# Altium footprint library Connector_PinHeader_1.27mm.PcbLib: 278 footprints (part 13 of 18)
Each footprint in its own frame and in the unit in brackets; x right, y up, seen from the top. Pads: shape width x height; smd on the part's side, far side on the other; paste and mask are expansions set on the pad; w line width, h text height; cw(c..) or ccw(c..) is an arc to the next point about the centre after c.
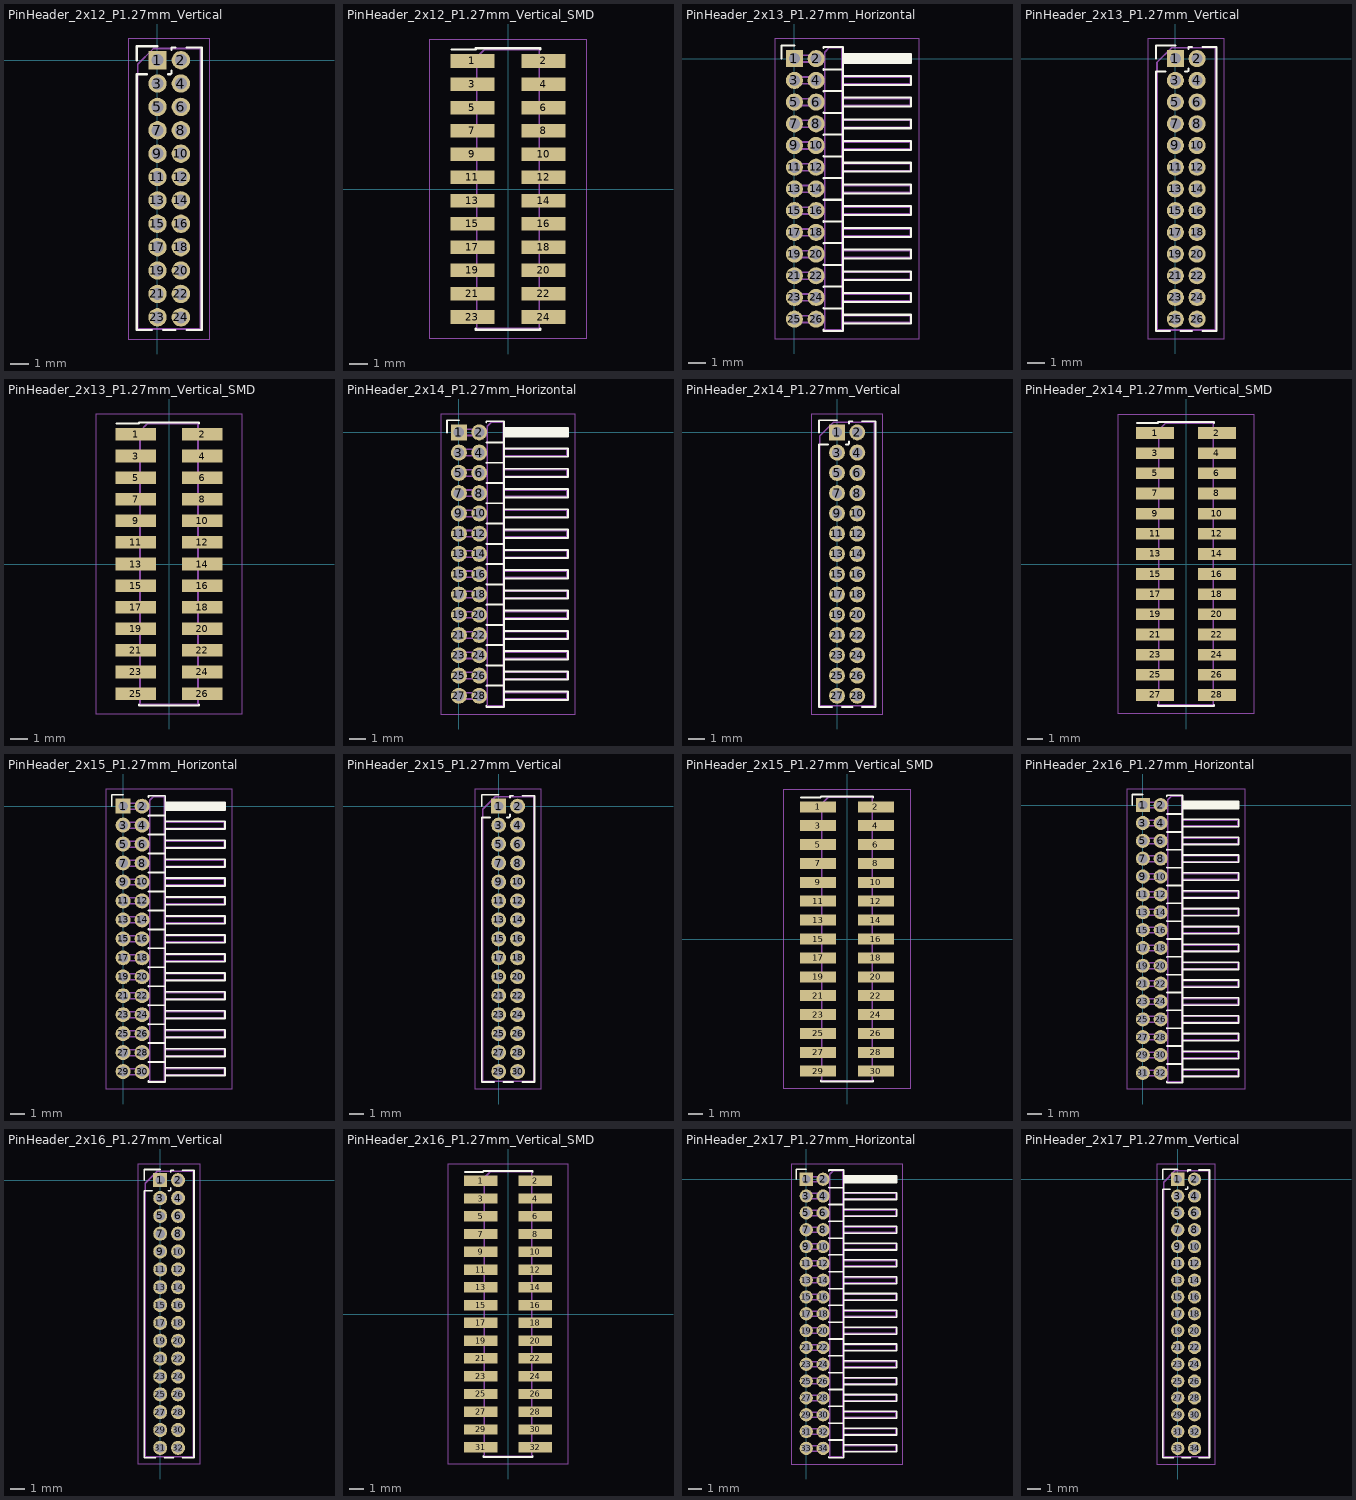
[diagram p12: the footprints below, top view; thin cyan lines are the x and y axes]

## PinHeader_2x12_P1.27mm_Vertical [mm]
pads (24):
  rect 1x1 hole 0.65: 1(0,0)
  rrect100% 1x1 hole 0.65: 2(1.27,0) 3(0,-1.27) 4(1.27,-1.27) 5(0,-2.54) 6(1.27,-2.54) 7(0,-3.81) 8(1.27,-3.81) 9(0,-5.08) 10(1.27,-5.08) 11(0,-6.35) 12(1.27,-6.35) 13(0,-7.62) 14(1.27,-7.62) 15(0,-8.89) 16(1.27,-8.89) 17(0,-10.16) 18(1.27,-10.16) 19(0,-11.43) 20(1.27,-11.43) 21(0,-12.7) 22(1.27,-12.7) 23(0,-13.97) 24(1.27,-13.97)
F.SilkS:
  lines w0.12: -1.13,0 -1.13,0.76 0,0.76 ; -0.563,-0.76 -1.13,-0.76 -1.13,-14.665 -0.308,-14.665 ; 0.308,-14.665 0.962,-14.665 ; 0.563,-0.76 0.707,-0.76 ; 0.76,-0.707 0.76,-0.563 ; 0.76,0.563 0.76,0.695 0.962,0.695 ; 1.578,-14.665 2.4,-14.665 2.4,0.695 1.578,0.695
F.CrtYd:
  lines w0.05: -1.6,-15.15 2.85,-15.15 2.85,1.15 -1.6,1.15 -1.6,-15.15
F.Fab:
  lines w0.1: -1.07,-14.605 -1.07,-0.218 -0.218,0.635 2.34,0.635 2.34,-14.605 -1.07,-14.605
  text "'.Designator'" at 1.475,-11.032 h1

## PinHeader_2x12_P1.27mm_Vertical_SMD [mm]
pads (24):
  rect 2.4x0.74 smd: 1(-1.95,6.985) 2(1.95,6.985) 3(-1.95,5.715) 4(1.95,5.715) 5(-1.95,4.445) 6(1.95,4.445) 7(-1.95,3.175) 8(1.95,3.175) 9(-1.95,1.905) 10(1.95,1.905) 11(-1.95,0.635) 12(1.95,0.635) 13(-1.95,-0.635) 14(1.95,-0.635) 15(-1.95,-1.905) 16(1.95,-1.905) 17(-1.95,-3.175) 18(1.95,-3.175) 19(-1.95,-4.445) 20(1.95,-4.445) 21(-1.95,-5.715) 22(1.95,-5.715) 23(-1.95,-6.985) 24(1.95,-6.985)
F.SilkS:
  lines w0.12: -3.09,7.615 -1.765,7.615 -1.765,7.68 1.765,7.68 1.765,7.615 ; -1.765,-7.615 -1.765,-7.68 1.765,-7.68 1.765,-7.615
F.CrtYd:
  lines w0.05: -4.3,-8.15 4.3,-8.15 4.3,8.15 -4.3,8.15 -4.3,-8.15
F.Fab:
  lines w0.1: -1.705,-7.185 -2.75,-7.185 -2.75,-6.785 -1.705,-6.785 ; -1.705,-5.915 -2.75,-5.915 -2.75,-5.515 -1.705,-5.515 ; -1.705,-4.645 -2.75,-4.645 -2.75,-4.245 -1.705,-4.245 ; -1.705,-3.375 -2.75,-3.375 -2.75,-2.975 -1.705,-2.975 ; -1.705,-2.105 -2.75,-2.105 -2.75,-1.705 -1.705,-1.705 ; -1.705,-0.835 -2.75,-0.835 -2.75,-0.435 -1.705,-0.435 ; -1.705,0.435 -2.75,0.435 -2.75,0.835 -1.705,0.835 ; -1.705,1.705 -2.75,1.705 -2.75,2.105 -1.705,2.105 ; -1.705,2.975 -2.75,2.975 -2.75,3.375 -1.705,3.375 ; -1.705,4.245 -2.75,4.245 -2.75,4.645 -1.705,4.645 ; -1.705,5.515 -2.75,5.515 -2.75,5.915 -1.705,5.915 ; -1.705,6.785 -2.75,6.785 -2.75,7.185 -1.705,7.185 ; 1.705,-7.185 2.75,-7.185 2.75,-6.785 1.705,-6.785 ; 1.705,-5.915 2.75,-5.915 2.75,-5.515 1.705,-5.515 ; 1.705,-4.645 2.75,-4.645 2.75,-4.245 1.705,-4.245 ; 1.705,-3.375 2.75,-3.375 2.75,-2.975 1.705,-2.975 ; 1.705,-2.105 2.75,-2.105 2.75,-1.705 1.705,-1.705 ; 1.705,-0.835 2.75,-0.835 2.75,-0.435 1.705,-0.435 ; 1.705,0.435 2.75,0.435 2.75,0.835 1.705,0.835 ; 1.705,1.705 2.75,1.705 2.75,2.105 1.705,2.105 ; 1.705,2.975 2.75,2.975 2.75,3.375 1.705,3.375 ; 1.705,4.245 2.75,4.245 2.75,4.645 1.705,4.645 ; 1.705,5.515 2.75,5.515 2.75,5.915 1.705,5.915 ; 1.705,6.785 2.75,6.785 2.75,7.185 1.705,7.185 ; -1.705,7.185 -1.27,7.62 1.705,7.62 1.705,-7.62 -1.705,-7.62 -1.705,7.185
  text "'.Designator'" at 0.84,-4.047 h1

## PinHeader_2x13_P1.27mm_Horizontal [mm]
pads (26):
  rect 1x1 hole 0.65: 1(0,0)
  rrect100% 1x1 hole 0.65: 2(1.27,0) 3(0,-1.27) 4(1.27,-1.27) 5(0,-2.54) 6(1.27,-2.54) 7(0,-3.81) 8(1.27,-3.81) 9(0,-5.08) 10(1.27,-5.08) 11(0,-6.35) 12(1.27,-6.35) 13(0,-7.62) 14(1.27,-7.62) 15(0,-8.89) 16(1.27,-8.89) 17(0,-10.16) 18(1.27,-10.16) 19(0,-11.43) 20(1.27,-11.43) 21(0,-12.7) 22(1.27,-12.7) 23(0,-13.97) 24(1.27,-13.97) 25(0,-15.24) 26(1.27,-15.24)
F.SilkS:
  lines w0.12: -0.76,0 -0.76,0.76 0,0.76 ; 1.71,-15.86 1.71,-15.935 2.83,-15.935 2.83,0.695 1.71,0.695 1.71,0.62 ; 1.71,-14.62 1.71,-14.59 ; 1.71,-14.605 2.83,-14.605 ; 1.71,-13.35 1.71,-13.32 ; 1.71,-13.335 2.83,-13.335 ; 1.71,-12.08 1.71,-12.05 ; 1.71,-12.065 2.83,-12.065 ; 1.71,-10.81 1.71,-10.78 ; 1.71,-10.795 2.83,-10.795 ; 1.71,-9.54 1.71,-9.51 ; 1.71,-9.525 2.83,-9.525 ; 1.71,-8.27 1.71,-8.24 ; 1.71,-8.255 2.83,-8.255 ; 1.71,-7 1.71,-6.97 ; 1.71,-6.985 2.83,-6.985 ; 1.71,-5.73 1.71,-5.7 ; 1.71,-5.715 2.83,-5.715 ; 1.71,-4.46 1.71,-4.43 ; 1.71,-4.445 2.83,-4.445 ; 1.71,-3.19 1.71,-3.16 ; 1.71,-3.175 2.83,-3.175 ; 1.71,-1.92 1.71,-1.89 ; 1.71,-1.905 2.83,-1.905 ; 1.71,-0.65 1.71,-0.62 ; 1.71,-0.635 2.83,-0.635 ; 2.83,-15.5 6.83,-15.5 6.83,-14.98 2.83,-14.98 ; 2.83,-14.23 6.83,-14.23 6.83,-13.71 2.83,-13.71 ; 2.83,-12.96 6.83,-12.96 6.83,-12.44 2.83,-12.44 ; 2.83,-11.69 6.83,-11.69 6.83,-11.17 2.83,-11.17 ; 2.83,-10.42 6.83,-10.42 6.83,-9.9 2.83,-9.9 ; 2.83,-9.15 6.83,-9.15 6.83,-8.63 2.83,-8.63 ; 2.83,-7.88 6.83,-7.88 6.83,-7.36 2.83,-7.36 ; 2.83,-6.61 6.83,-6.61 6.83,-6.09 2.83,-6.09 ; 2.83,-5.34 6.83,-5.34 6.83,-4.82 2.83,-4.82 ; 2.83,-4.07 6.83,-4.07 6.83,-3.55 2.83,-3.55 ; 2.83,-2.8 6.83,-2.8 6.83,-2.28 2.83,-2.28 ; 2.83,-1.53 6.83,-1.53 6.83,-1.01 2.83,-1.01 ; 2.83,-0.26 6.83,-0.26 6.83,0.26 2.83,0.26 ; 2.83,-0.16 6.83,-0.16 ; 2.83,-0.04 6.83,-0.04 ; 2.83,0.08 6.83,0.08 ; 2.83,0.2 6.83,0.2
F.CrtYd:
  lines w0.05: -1.15,-16.4 -1.15,1.15 7.3,1.15 7.3,-16.4 -1.15,-16.4
F.Fab:
  lines w0.1: 1.77,-15.44 -0.2,-15.44 -0.2,-15.04 1.77,-15.04 ; 1.77,-14.17 -0.2,-14.17 -0.2,-13.77 1.77,-13.77 ; 1.77,-12.9 -0.2,-12.9 -0.2,-12.5 1.77,-12.5 ; 1.77,-11.63 -0.2,-11.63 -0.2,-11.23 1.77,-11.23 ; 1.77,-10.36 -0.2,-10.36 -0.2,-9.96 1.77,-9.96 ; 1.77,-9.09 -0.2,-9.09 -0.2,-8.69 1.77,-8.69 ; 1.77,-7.82 -0.2,-7.82 -0.2,-7.42 1.77,-7.42 ; 1.77,-6.55 -0.2,-6.55 -0.2,-6.15 1.77,-6.15 ; 1.77,-5.28 -0.2,-5.28 -0.2,-4.88 1.77,-4.88 ; 1.77,-4.01 -0.2,-4.01 -0.2,-3.61 1.77,-3.61 ; 1.77,-2.74 -0.2,-2.74 -0.2,-2.34 1.77,-2.34 ; 1.77,-1.47 -0.2,-1.47 -0.2,-1.07 1.77,-1.07 ; 1.77,-0.2 -0.2,-0.2 -0.2,0.2 1.77,0.2 ; 2.77,-15.44 6.77,-15.44 6.77,-15.04 2.77,-15.04 ; 2.77,-14.17 6.77,-14.17 6.77,-13.77 2.77,-13.77 ; 2.77,-12.9 6.77,-12.9 6.77,-12.5 2.77,-12.5 ; 2.77,-11.63 6.77,-11.63 6.77,-11.23 2.77,-11.23 ; 2.77,-10.36 6.77,-10.36 6.77,-9.96 2.77,-9.96 ; 2.77,-9.09 6.77,-9.09 6.77,-8.69 2.77,-8.69 ; 2.77,-7.82 6.77,-7.82 6.77,-7.42 2.77,-7.42 ; 2.77,-6.55 6.77,-6.55 6.77,-6.15 2.77,-6.15 ; 2.77,-5.28 6.77,-5.28 6.77,-4.88 2.77,-4.88 ; 2.77,-4.01 6.77,-4.01 6.77,-3.61 2.77,-3.61 ; 2.77,-2.74 6.77,-2.74 6.77,-2.34 2.77,-2.34 ; 2.77,-1.47 6.77,-1.47 6.77,-1.07 2.77,-1.07 ; 2.77,-0.2 6.77,-0.2 6.77,0.2 2.77,0.2 ; 1.77,-15.875 2.77,-15.875 2.77,0.635 2.02,0.635 1.77,0.385 1.77,-15.875
  text "'.Designator'" at 2.774,-10.048 h0.6

## PinHeader_2x13_P1.27mm_Vertical [mm]
pads (26):
  rect 1x1 hole 0.65: 1(0,0)
  rrect100% 1x1 hole 0.65: 2(1.27,0) 3(0,-1.27) 4(1.27,-1.27) 5(0,-2.54) 6(1.27,-2.54) 7(0,-3.81) 8(1.27,-3.81) 9(0,-5.08) 10(1.27,-5.08) 11(0,-6.35) 12(1.27,-6.35) 13(0,-7.62) 14(1.27,-7.62) 15(0,-8.89) 16(1.27,-8.89) 17(0,-10.16) 18(1.27,-10.16) 19(0,-11.43) 20(1.27,-11.43) 21(0,-12.7) 22(1.27,-12.7) 23(0,-13.97) 24(1.27,-13.97) 25(0,-15.24) 26(1.27,-15.24)
F.SilkS:
  lines w0.12: -1.13,0 -1.13,0.76 0,0.76 ; -0.563,-0.76 -1.13,-0.76 -1.13,-15.935 -0.308,-15.935 ; 0.308,-15.935 0.962,-15.935 ; 0.563,-0.76 0.707,-0.76 ; 0.76,-0.707 0.76,-0.563 ; 0.76,0.563 0.76,0.695 0.962,0.695 ; 1.578,-15.935 2.4,-15.935 2.4,0.695 1.578,0.695
F.CrtYd:
  lines w0.05: -1.6,-16.4 2.85,-16.4 2.85,1.15 -1.6,1.15 -1.6,-16.4
F.Fab:
  lines w0.1: -1.07,-15.875 2.34,-15.875 2.34,0.635 -0.218,0.635 -1.07,-0.218 -1.07,-15.875
  text "'.Designator'" at 1.475,-11.667 h1

## PinHeader_2x13_P1.27mm_Vertical_SMD [mm]
pads (26):
  rect 2.4x0.74 smd: 1(-1.95,7.62) 2(1.95,7.62) 3(-1.95,6.35) 4(1.95,6.35) 5(-1.95,5.08) 6(1.95,5.08) 7(-1.95,3.81) 8(1.95,3.81) 9(-1.95,2.54) 10(1.95,2.54) 11(-1.95,1.27) 12(1.95,1.27) 13(-1.95,0) 14(1.95,0) 15(-1.95,-1.27) 16(1.95,-1.27) 17(-1.95,-2.54) 18(1.95,-2.54) 19(-1.95,-3.81) 20(1.95,-3.81) 21(-1.95,-5.08) 22(1.95,-5.08) 23(-1.95,-6.35) 24(1.95,-6.35) 25(-1.95,-7.62) 26(1.95,-7.62)
F.SilkS:
  lines w0.12: -3.09,8.25 -1.765,8.25 -1.765,8.315 1.765,8.315 1.765,8.25 ; -1.765,-8.25 -1.765,-8.315 1.765,-8.315 1.765,-8.25
F.CrtYd:
  lines w0.05: -4.3,-8.8 4.3,-8.8 4.3,8.8 -4.3,8.8 -4.3,-8.8
F.Fab:
  lines w0.1: -1.705,-7.82 -2.75,-7.82 -2.75,-7.42 -1.705,-7.42 ; -1.705,-6.55 -2.75,-6.55 -2.75,-6.15 -1.705,-6.15 ; -1.705,-5.28 -2.75,-5.28 -2.75,-4.88 -1.705,-4.88 ; -1.705,-4.01 -2.75,-4.01 -2.75,-3.61 -1.705,-3.61 ; -1.705,-2.74 -2.75,-2.74 -2.75,-2.34 -1.705,-2.34 ; -1.705,-1.47 -2.75,-1.47 -2.75,-1.07 -1.705,-1.07 ; -1.705,-0.2 -2.75,-0.2 -2.75,0.2 -1.705,0.2 ; -1.705,1.07 -2.75,1.07 -2.75,1.47 -1.705,1.47 ; -1.705,2.34 -2.75,2.34 -2.75,2.74 -1.705,2.74 ; -1.705,3.61 -2.75,3.61 -2.75,4.01 -1.705,4.01 ; -1.705,4.88 -2.75,4.88 -2.75,5.28 -1.705,5.28 ; -1.705,6.15 -2.75,6.15 -2.75,6.55 -1.705,6.55 ; -1.705,7.42 -2.75,7.42 -2.75,7.82 -1.705,7.82 ; 1.705,-7.82 2.75,-7.82 2.75,-7.42 1.705,-7.42 ; 1.705,-6.55 2.75,-6.55 2.75,-6.15 1.705,-6.15 ; 1.705,-5.28 2.75,-5.28 2.75,-4.88 1.705,-4.88 ; 1.705,-4.01 2.75,-4.01 2.75,-3.61 1.705,-3.61 ; 1.705,-2.74 2.75,-2.74 2.75,-2.34 1.705,-2.34 ; 1.705,-1.47 2.75,-1.47 2.75,-1.07 1.705,-1.07 ; 1.705,-0.2 2.75,-0.2 2.75,0.2 1.705,0.2 ; 1.705,1.07 2.75,1.07 2.75,1.47 1.705,1.47 ; 1.705,2.34 2.75,2.34 2.75,2.74 1.705,2.74 ; 1.705,3.61 2.75,3.61 2.75,4.01 1.705,4.01 ; 1.705,4.88 2.75,4.88 2.75,5.28 1.705,5.28 ; 1.705,6.15 2.75,6.15 2.75,6.55 1.705,6.55 ; 1.705,7.42 2.75,7.42 2.75,7.82 1.705,7.82 ; -1.705,7.82 -1.705,-8.255 1.705,-8.255 1.705,8.255 -1.27,8.255 -1.705,7.82
  text "'.Designator'" at 0.84,-4.047 h1

## PinHeader_2x14_P1.27mm_Horizontal [mm]
pads (28):
  rect 1x1 hole 0.65: 1(0,0)
  rrect100% 1x1 hole 0.65: 2(1.27,0) 3(0,-1.27) 4(1.27,-1.27) 5(0,-2.54) 6(1.27,-2.54) 7(0,-3.81) 8(1.27,-3.81) 9(0,-5.08) 10(1.27,-5.08) 11(0,-6.35) 12(1.27,-6.35) 13(0,-7.62) 14(1.27,-7.62) 15(0,-8.89) 16(1.27,-8.89) 17(0,-10.16) 18(1.27,-10.16) 19(0,-11.43) 20(1.27,-11.43) 21(0,-12.7) 22(1.27,-12.7) 23(0,-13.97) 24(1.27,-13.97) 25(0,-15.24) 26(1.27,-15.24) 27(0,-16.51) 28(1.27,-16.51)
F.SilkS:
  lines w0.12: -0.76,0 -0.76,0.76 0,0.76 ; 1.71,-17.13 1.71,-17.205 2.83,-17.205 2.83,0.695 1.71,0.695 1.71,0.62 ; 1.71,-15.89 1.71,-15.86 ; 1.71,-15.875 2.83,-15.875 ; 1.71,-14.62 1.71,-14.59 ; 1.71,-14.605 2.83,-14.605 ; 1.71,-13.35 1.71,-13.32 ; 1.71,-13.335 2.83,-13.335 ; 1.71,-12.08 1.71,-12.05 ; 1.71,-12.065 2.83,-12.065 ; 1.71,-10.81 1.71,-10.78 ; 1.71,-10.795 2.83,-10.795 ; 1.71,-9.54 1.71,-9.51 ; 1.71,-9.525 2.83,-9.525 ; 1.71,-8.27 1.71,-8.24 ; 1.71,-8.255 2.83,-8.255 ; 1.71,-7 1.71,-6.97 ; 1.71,-6.985 2.83,-6.985 ; 1.71,-5.73 1.71,-5.7 ; 1.71,-5.715 2.83,-5.715 ; 1.71,-4.46 1.71,-4.43 ; 1.71,-4.445 2.83,-4.445 ; 1.71,-3.19 1.71,-3.16 ; 1.71,-3.175 2.83,-3.175 ; 1.71,-1.92 1.71,-1.89 ; 1.71,-1.905 2.83,-1.905 ; 1.71,-0.65 1.71,-0.62 ; 1.71,-0.635 2.83,-0.635 ; 2.83,-16.77 6.83,-16.77 6.83,-16.25 2.83,-16.25 ; 2.83,-15.5 6.83,-15.5 6.83,-14.98 2.83,-14.98 ; 2.83,-14.23 6.83,-14.23 6.83,-13.71 2.83,-13.71 ; 2.83,-12.96 6.83,-12.96 6.83,-12.44 2.83,-12.44 ; 2.83,-11.69 6.83,-11.69 6.83,-11.17 2.83,-11.17 ; 2.83,-10.42 6.83,-10.42 6.83,-9.9 2.83,-9.9 ; 2.83,-9.15 6.83,-9.15 6.83,-8.63 2.83,-8.63 ; 2.83,-7.88 6.83,-7.88 6.83,-7.36 2.83,-7.36 ; 2.83,-6.61 6.83,-6.61 6.83,-6.09 2.83,-6.09 ; 2.83,-5.34 6.83,-5.34 6.83,-4.82 2.83,-4.82 ; 2.83,-4.07 6.83,-4.07 6.83,-3.55 2.83,-3.55 ; 2.83,-2.8 6.83,-2.8 6.83,-2.28 2.83,-2.28 ; 2.83,-1.53 6.83,-1.53 6.83,-1.01 2.83,-1.01 ; 2.83,-0.26 6.83,-0.26 6.83,0.26 2.83,0.26 ; 2.83,-0.16 6.83,-0.16 ; 2.83,-0.04 6.83,-0.04 ; 2.83,0.08 6.83,0.08 ; 2.83,0.2 6.83,0.2
F.CrtYd:
  lines w0.05: -1.15,-17.65 7.3,-17.65 7.3,1.15 -1.15,1.15 -1.15,-17.65
F.Fab:
  lines w0.1: 1.77,-16.71 -0.2,-16.71 -0.2,-16.31 1.77,-16.31 ; 1.77,-15.44 -0.2,-15.44 -0.2,-15.04 1.77,-15.04 ; 1.77,-14.17 -0.2,-14.17 -0.2,-13.77 1.77,-13.77 ; 1.77,-12.9 -0.2,-12.9 -0.2,-12.5 1.77,-12.5 ; 1.77,-11.63 -0.2,-11.63 -0.2,-11.23 1.77,-11.23 ; 1.77,-10.36 -0.2,-10.36 -0.2,-9.96 1.77,-9.96 ; 1.77,-9.09 -0.2,-9.09 -0.2,-8.69 1.77,-8.69 ; 1.77,-7.82 -0.2,-7.82 -0.2,-7.42 1.77,-7.42 ; 1.77,-6.55 -0.2,-6.55 -0.2,-6.15 1.77,-6.15 ; 1.77,-5.28 -0.2,-5.28 -0.2,-4.88 1.77,-4.88 ; 1.77,-4.01 -0.2,-4.01 -0.2,-3.61 1.77,-3.61 ; 1.77,-2.74 -0.2,-2.74 -0.2,-2.34 1.77,-2.34 ; 1.77,-1.47 -0.2,-1.47 -0.2,-1.07 1.77,-1.07 ; 1.77,-0.2 -0.2,-0.2 -0.2,0.2 1.77,0.2 ; 2.77,-16.71 6.77,-16.71 6.77,-16.31 2.77,-16.31 ; 2.77,-15.44 6.77,-15.44 6.77,-15.04 2.77,-15.04 ; 2.77,-14.17 6.77,-14.17 6.77,-13.77 2.77,-13.77 ; 2.77,-12.9 6.77,-12.9 6.77,-12.5 2.77,-12.5 ; 2.77,-11.63 6.77,-11.63 6.77,-11.23 2.77,-11.23 ; 2.77,-10.36 6.77,-10.36 6.77,-9.96 2.77,-9.96 ; 2.77,-9.09 6.77,-9.09 6.77,-8.69 2.77,-8.69 ; 2.77,-7.82 6.77,-7.82 6.77,-7.42 2.77,-7.42 ; 2.77,-6.55 6.77,-6.55 6.77,-6.15 2.77,-6.15 ; 2.77,-5.28 6.77,-5.28 6.77,-4.88 2.77,-4.88 ; 2.77,-4.01 6.77,-4.01 6.77,-3.61 2.77,-3.61 ; 2.77,-2.74 6.77,-2.74 6.77,-2.34 2.77,-2.34 ; 2.77,-1.47 6.77,-1.47 6.77,-1.07 2.77,-1.07 ; 2.77,-0.2 6.77,-0.2 6.77,0.2 2.77,0.2 ; 1.77,-17.145 2.77,-17.145 2.77,0.635 2.02,0.635 1.77,0.385 1.77,-17.145
  text "'.Designator'" at 2.774,-10.683 h0.6

## PinHeader_2x14_P1.27mm_Vertical [mm]
pads (28):
  rect 1x1 hole 0.65: 1(0,0)
  rrect100% 1x1 hole 0.65: 2(1.27,0) 3(0,-1.27) 4(1.27,-1.27) 5(0,-2.54) 6(1.27,-2.54) 7(0,-3.81) 8(1.27,-3.81) 9(0,-5.08) 10(1.27,-5.08) 11(0,-6.35) 12(1.27,-6.35) 13(0,-7.62) 14(1.27,-7.62) 15(0,-8.89) 16(1.27,-8.89) 17(0,-10.16) 18(1.27,-10.16) 19(0,-11.43) 20(1.27,-11.43) 21(0,-12.7) 22(1.27,-12.7) 23(0,-13.97) 24(1.27,-13.97) 25(0,-15.24) 26(1.27,-15.24) 27(0,-16.51) 28(1.27,-16.51)
F.SilkS:
  lines w0.12: -1.13,0 -1.13,0.76 0,0.76 ; -0.563,-0.76 -1.13,-0.76 -1.13,-17.205 -0.308,-17.205 ; 0.308,-17.205 0.962,-17.205 ; 0.563,-0.76 0.707,-0.76 ; 0.76,-0.707 0.76,-0.563 ; 0.76,0.563 0.76,0.695 0.962,0.695 ; 1.578,-17.205 2.4,-17.205 2.4,0.695 1.578,0.695
F.CrtYd:
  lines w0.05: -1.6,-17.65 2.85,-17.65 2.85,1.15 -1.6,1.15 -1.6,-17.65
F.Fab:
  lines w0.1: -1.07,-17.145 -1.07,-0.218 -0.218,0.635 2.34,0.635 2.34,-17.145 -1.07,-17.145
  text "'.Designator'" at 1.475,-12.302 h1

## PinHeader_2x14_P1.27mm_Vertical_SMD [mm]
pads (28):
  rect 2.4x0.74 smd: 1(-1.95,8.255) 2(1.95,8.255) 3(-1.95,6.985) 4(1.95,6.985) 5(-1.95,5.715) 6(1.95,5.715) 7(-1.95,4.445) 8(1.95,4.445) 9(-1.95,3.175) 10(1.95,3.175) 11(-1.95,1.905) 12(1.95,1.905) 13(-1.95,0.635) 14(1.95,0.635) 15(-1.95,-0.635) 16(1.95,-0.635) 17(-1.95,-1.905) 18(1.95,-1.905) 19(-1.95,-3.175) 20(1.95,-3.175) 21(-1.95,-4.445) 22(1.95,-4.445) 23(-1.95,-5.715) 24(1.95,-5.715) 25(-1.95,-6.985) 26(1.95,-6.985) 27(-1.95,-8.255) 28(1.95,-8.255)
F.SilkS:
  lines w0.12: -3.09,8.885 -1.765,8.885 -1.765,8.95 1.765,8.95 1.765,8.885 ; -1.765,-8.885 -1.765,-8.95 1.765,-8.95 1.765,-8.885
F.CrtYd:
  lines w0.05: -4.3,-9.4 4.3,-9.4 4.3,9.4 -4.3,9.4 -4.3,-9.4
F.Fab:
  lines w0.1: -1.705,-8.455 -2.75,-8.455 -2.75,-8.055 -1.705,-8.055 ; -1.705,-7.185 -2.75,-7.185 -2.75,-6.785 -1.705,-6.785 ; -1.705,-5.915 -2.75,-5.915 -2.75,-5.515 -1.705,-5.515 ; -1.705,-4.645 -2.75,-4.645 -2.75,-4.245 -1.705,-4.245 ; -1.705,-3.375 -2.75,-3.375 -2.75,-2.975 -1.705,-2.975 ; -1.705,-2.105 -2.75,-2.105 -2.75,-1.705 -1.705,-1.705 ; -1.705,-0.835 -2.75,-0.835 -2.75,-0.435 -1.705,-0.435 ; -1.705,0.435 -2.75,0.435 -2.75,0.835 -1.705,0.835 ; -1.705,1.705 -2.75,1.705 -2.75,2.105 -1.705,2.105 ; -1.705,2.975 -2.75,2.975 -2.75,3.375 -1.705,3.375 ; -1.705,4.245 -2.75,4.245 -2.75,4.645 -1.705,4.645 ; -1.705,5.515 -2.75,5.515 -2.75,5.915 -1.705,5.915 ; -1.705,6.785 -2.75,6.785 -2.75,7.185 -1.705,7.185 ; -1.705,8.055 -2.75,8.055 -2.75,8.455 -1.705,8.455 ; 1.705,-8.455 2.75,-8.455 2.75,-8.055 1.705,-8.055 ; 1.705,-7.185 2.75,-7.185 2.75,-6.785 1.705,-6.785 ; 1.705,-5.915 2.75,-5.915 2.75,-5.515 1.705,-5.515 ; 1.705,-4.645 2.75,-4.645 2.75,-4.245 1.705,-4.245 ; 1.705,-3.375 2.75,-3.375 2.75,-2.975 1.705,-2.975 ; 1.705,-2.105 2.75,-2.105 2.75,-1.705 1.705,-1.705 ; 1.705,-0.835 2.75,-0.835 2.75,-0.435 1.705,-0.435 ; 1.705,0.435 2.75,0.435 2.75,0.835 1.705,0.835 ; 1.705,1.705 2.75,1.705 2.75,2.105 1.705,2.105 ; 1.705,2.975 2.75,2.975 2.75,3.375 1.705,3.375 ; 1.705,4.245 2.75,4.245 2.75,4.645 1.705,4.645 ; 1.705,5.515 2.75,5.515 2.75,5.915 1.705,5.915 ; 1.705,6.785 2.75,6.785 2.75,7.185 1.705,7.185 ; 1.705,8.055 2.75,8.055 2.75,8.455 1.705,8.455 ; -1.705,8.455 -1.27,8.89 1.705,8.89 1.705,-8.89 -1.705,-8.89 -1.705,8.455
  text "'.Designator'" at 0.84,-4.047 h1

## PinHeader_2x15_P1.27mm_Horizontal [mm]
pads (30):
  rect 1x1 hole 0.65: 1(0,0)
  rrect100% 1x1 hole 0.65: 2(1.27,0) 3(0,-1.27) 4(1.27,-1.27) 5(0,-2.54) 6(1.27,-2.54) 7(0,-3.81) 8(1.27,-3.81) 9(0,-5.08) 10(1.27,-5.08) 11(0,-6.35) 12(1.27,-6.35) 13(0,-7.62) 14(1.27,-7.62) 15(0,-8.89) 16(1.27,-8.89) 17(0,-10.16) 18(1.27,-10.16) 19(0,-11.43) 20(1.27,-11.43) 21(0,-12.7) 22(1.27,-12.7) 23(0,-13.97) 24(1.27,-13.97) 25(0,-15.24) 26(1.27,-15.24) 27(0,-16.51) 28(1.27,-16.51) 29(0,-17.78) 30(1.27,-17.78)
F.SilkS:
  lines w0.12: -0.76,0 -0.76,0.76 0,0.76 ; 1.71,-18.4 1.71,-18.475 2.83,-18.475 2.83,0.695 1.71,0.695 1.71,0.62 ; 1.71,-17.16 1.71,-17.13 ; 1.71,-17.145 2.83,-17.145 ; 1.71,-15.89 1.71,-15.86 ; 1.71,-15.875 2.83,-15.875 ; 1.71,-14.62 1.71,-14.59 ; 1.71,-14.605 2.83,-14.605 ; 1.71,-13.35 1.71,-13.32 ; 1.71,-13.335 2.83,-13.335 ; 1.71,-12.08 1.71,-12.05 ; 1.71,-12.065 2.83,-12.065 ; 1.71,-10.81 1.71,-10.78 ; 1.71,-10.795 2.83,-10.795 ; 1.71,-9.54 1.71,-9.51 ; 1.71,-9.525 2.83,-9.525 ; 1.71,-8.27 1.71,-8.24 ; 1.71,-8.255 2.83,-8.255 ; 1.71,-7 1.71,-6.97 ; 1.71,-6.985 2.83,-6.985 ; 1.71,-5.73 1.71,-5.7 ; 1.71,-5.715 2.83,-5.715 ; 1.71,-4.46 1.71,-4.43 ; 1.71,-4.445 2.83,-4.445 ; 1.71,-3.19 1.71,-3.16 ; 1.71,-3.175 2.83,-3.175 ; 1.71,-1.92 1.71,-1.89 ; 1.71,-1.905 2.83,-1.905 ; 1.71,-0.65 1.71,-0.62 ; 1.71,-0.635 2.83,-0.635 ; 2.83,-18.04 6.83,-18.04 6.83,-17.52 2.83,-17.52 ; 2.83,-16.77 6.83,-16.77 6.83,-16.25 2.83,-16.25 ; 2.83,-15.5 6.83,-15.5 6.83,-14.98 2.83,-14.98 ; 2.83,-14.23 6.83,-14.23 6.83,-13.71 2.83,-13.71 ; 2.83,-12.96 6.83,-12.96 6.83,-12.44 2.83,-12.44 ; 2.83,-11.69 6.83,-11.69 6.83,-11.17 2.83,-11.17 ; 2.83,-10.42 6.83,-10.42 6.83,-9.9 2.83,-9.9 ; 2.83,-9.15 6.83,-9.15 6.83,-8.63 2.83,-8.63 ; 2.83,-7.88 6.83,-7.88 6.83,-7.36 2.83,-7.36 ; 2.83,-6.61 6.83,-6.61 6.83,-6.09 2.83,-6.09 ; 2.83,-5.34 6.83,-5.34 6.83,-4.82 2.83,-4.82 ; 2.83,-4.07 6.83,-4.07 6.83,-3.55 2.83,-3.55 ; 2.83,-2.8 6.83,-2.8 6.83,-2.28 2.83,-2.28 ; 2.83,-1.53 6.83,-1.53 6.83,-1.01 2.83,-1.01 ; 2.83,-0.26 6.83,-0.26 6.83,0.26 2.83,0.26 ; 2.83,-0.16 6.83,-0.16 ; 2.83,-0.04 6.83,-0.04 ; 2.83,0.08 6.83,0.08 ; 2.83,0.2 6.83,0.2
F.CrtYd:
  lines w0.05: -1.15,-18.95 -1.15,1.15 7.3,1.15 7.3,-18.95 -1.15,-18.95
F.Fab:
  lines w0.1: 1.77,-17.98 -0.2,-17.98 -0.2,-17.58 1.77,-17.58 ; 1.77,-16.71 -0.2,-16.71 -0.2,-16.31 1.77,-16.31 ; 1.77,-15.44 -0.2,-15.44 -0.2,-15.04 1.77,-15.04 ; 1.77,-14.17 -0.2,-14.17 -0.2,-13.77 1.77,-13.77 ; 1.77,-12.9 -0.2,-12.9 -0.2,-12.5 1.77,-12.5 ; 1.77,-11.63 -0.2,-11.63 -0.2,-11.23 1.77,-11.23 ; 1.77,-10.36 -0.2,-10.36 -0.2,-9.96 1.77,-9.96 ; 1.77,-9.09 -0.2,-9.09 -0.2,-8.69 1.77,-8.69 ; 1.77,-7.82 -0.2,-7.82 -0.2,-7.42 1.77,-7.42 ; 1.77,-6.55 -0.2,-6.55 -0.2,-6.15 1.77,-6.15 ; 1.77,-5.28 -0.2,-5.28 -0.2,-4.88 1.77,-4.88 ; 1.77,-4.01 -0.2,-4.01 -0.2,-3.61 1.77,-3.61 ; 1.77,-2.74 -0.2,-2.74 -0.2,-2.34 1.77,-2.34 ; 1.77,-1.47 -0.2,-1.47 -0.2,-1.07 1.77,-1.07 ; 1.77,-0.2 -0.2,-0.2 -0.2,0.2 1.77,0.2 ; 2.77,-17.98 6.77,-17.98 6.77,-17.58 2.77,-17.58 ; 2.77,-16.71 6.77,-16.71 6.77,-16.31 2.77,-16.31 ; 2.77,-15.44 6.77,-15.44 6.77,-15.04 2.77,-15.04 ; 2.77,-14.17 6.77,-14.17 6.77,-13.77 2.77,-13.77 ; 2.77,-12.9 6.77,-12.9 6.77,-12.5 2.77,-12.5 ; 2.77,-11.63 6.77,-11.63 6.77,-11.23 2.77,-11.23 ; 2.77,-10.36 6.77,-10.36 6.77,-9.96 2.77,-9.96 ; 2.77,-9.09 6.77,-9.09 6.77,-8.69 2.77,-8.69 ; 2.77,-7.82 6.77,-7.82 6.77,-7.42 2.77,-7.42 ; 2.77,-6.55 6.77,-6.55 6.77,-6.15 2.77,-6.15 ; 2.77,-5.28 6.77,-5.28 6.77,-4.88 2.77,-4.88 ; 2.77,-4.01 6.77,-4.01 6.77,-3.61 2.77,-3.61 ; 2.77,-2.74 6.77,-2.74 6.77,-2.34 2.77,-2.34 ; 2.77,-1.47 6.77,-1.47 6.77,-1.07 2.77,-1.07 ; 2.77,-0.2 6.77,-0.2 6.77,0.2 2.77,0.2 ; 1.77,-18.415 1.77,0.385 2.02,0.635 2.77,0.635 2.77,-18.415 1.77,-18.415
  text "'.Designator'" at 2.774,-11.318 h0.6

## PinHeader_2x15_P1.27mm_Vertical [mm]
pads (30):
  rect 1x1 hole 0.65: 1(0,0)
  rrect100% 1x1 hole 0.65: 2(1.27,0) 3(0,-1.27) 4(1.27,-1.27) 5(0,-2.54) 6(1.27,-2.54) 7(0,-3.81) 8(1.27,-3.81) 9(0,-5.08) 10(1.27,-5.08) 11(0,-6.35) 12(1.27,-6.35) 13(0,-7.62) 14(1.27,-7.62) 15(0,-8.89) 16(1.27,-8.89) 17(0,-10.16) 18(1.27,-10.16) 19(0,-11.43) 20(1.27,-11.43) 21(0,-12.7) 22(1.27,-12.7) 23(0,-13.97) 24(1.27,-13.97) 25(0,-15.24) 26(1.27,-15.24) 27(0,-16.51) 28(1.27,-16.51) 29(0,-17.78) 30(1.27,-17.78)
F.SilkS:
  lines w0.12: -1.13,0 -1.13,0.76 0,0.76 ; -0.563,-0.76 -1.13,-0.76 -1.13,-18.475 -0.308,-18.475 ; 0.308,-18.475 0.962,-18.475 ; 0.563,-0.76 0.707,-0.76 ; 0.76,-0.707 0.76,-0.563 ; 0.76,0.563 0.76,0.695 0.962,0.695 ; 1.578,-18.475 2.4,-18.475 2.4,0.695 1.578,0.695
F.CrtYd:
  lines w0.05: -1.6,-18.95 2.85,-18.95 2.85,1.15 -1.6,1.15 -1.6,-18.95
F.Fab:
  lines w0.1: -1.07,-18.415 2.34,-18.415 2.34,0.635 -0.218,0.635 -1.07,-0.218 -1.07,-18.415
  text "'.Designator'" at 1.475,-12.937 h1

## PinHeader_2x15_P1.27mm_Vertical_SMD [mm]
pads (30):
  rect 2.4x0.74 smd: 1(-1.95,8.89) 2(1.95,8.89) 3(-1.95,7.62) 4(1.95,7.62) 5(-1.95,6.35) 6(1.95,6.35) 7(-1.95,5.08) 8(1.95,5.08) 9(-1.95,3.81) 10(1.95,3.81) 11(-1.95,2.54) 12(1.95,2.54) 13(-1.95,1.27) 14(1.95,1.27) 15(-1.95,0) 16(1.95,0) 17(-1.95,-1.27) 18(1.95,-1.27) 19(-1.95,-2.54) 20(1.95,-2.54) 21(-1.95,-3.81) 22(1.95,-3.81) 23(-1.95,-5.08) 24(1.95,-5.08) 25(-1.95,-6.35) 26(1.95,-6.35) 27(-1.95,-7.62) 28(1.95,-7.62) 29(-1.95,-8.89) 30(1.95,-8.89)
F.SilkS:
  lines w0.12: -3.09,9.52 -1.765,9.52 -1.765,9.585 1.765,9.585 1.765,9.52 ; -1.765,-9.52 -1.765,-9.585 1.765,-9.585 1.765,-9.52
F.CrtYd:
  lines w0.05: -4.3,-10.05 4.3,-10.05 4.3,10.05 -4.3,10.05 -4.3,-10.05
F.Fab:
  lines w0.1: -1.705,-9.09 -2.75,-9.09 -2.75,-8.69 -1.705,-8.69 ; -1.705,-7.82 -2.75,-7.82 -2.75,-7.42 -1.705,-7.42 ; -1.705,-6.55 -2.75,-6.55 -2.75,-6.15 -1.705,-6.15 ; -1.705,-5.28 -2.75,-5.28 -2.75,-4.88 -1.705,-4.88 ; -1.705,-4.01 -2.75,-4.01 -2.75,-3.61 -1.705,-3.61 ; -1.705,-2.74 -2.75,-2.74 -2.75,-2.34 -1.705,-2.34 ; -1.705,-1.47 -2.75,-1.47 -2.75,-1.07 -1.705,-1.07 ; -1.705,-0.2 -2.75,-0.2 -2.75,0.2 -1.705,0.2 ; -1.705,1.07 -2.75,1.07 -2.75,1.47 -1.705,1.47 ; -1.705,2.34 -2.75,2.34 -2.75,2.74 -1.705,2.74 ; -1.705,3.61 -2.75,3.61 -2.75,4.01 -1.705,4.01 ; -1.705,4.88 -2.75,4.88 -2.75,5.28 -1.705,5.28 ; -1.705,6.15 -2.75,6.15 -2.75,6.55 -1.705,6.55 ; -1.705,7.42 -2.75,7.42 -2.75,7.82 -1.705,7.82 ; -1.705,8.69 -2.75,8.69 -2.75,9.09 -1.705,9.09 ; 1.705,-9.09 2.75,-9.09 2.75,-8.69 1.705,-8.69 ; 1.705,-7.82 2.75,-7.82 2.75,-7.42 1.705,-7.42 ; 1.705,-6.55 2.75,-6.55 2.75,-6.15 1.705,-6.15 ; 1.705,-5.28 2.75,-5.28 2.75,-4.88 1.705,-4.88 ; 1.705,-4.01 2.75,-4.01 2.75,-3.61 1.705,-3.61 ; 1.705,-2.74 2.75,-2.74 2.75,-2.34 1.705,-2.34 ; 1.705,-1.47 2.75,-1.47 2.75,-1.07 1.705,-1.07 ; 1.705,-0.2 2.75,-0.2 2.75,0.2 1.705,0.2 ; 1.705,1.07 2.75,1.07 2.75,1.47 1.705,1.47 ; 1.705,2.34 2.75,2.34 2.75,2.74 1.705,2.74 ; 1.705,3.61 2.75,3.61 2.75,4.01 1.705,4.01 ; 1.705,4.88 2.75,4.88 2.75,5.28 1.705,5.28 ; 1.705,6.15 2.75,6.15 2.75,6.55 1.705,6.55 ; 1.705,7.42 2.75,7.42 2.75,7.82 1.705,7.82 ; 1.705,8.69 2.75,8.69 2.75,9.09 1.705,9.09 ; -1.705,9.09 -1.27,9.525 1.705,9.525 1.705,-9.525 -1.705,-9.525 -1.705,9.09
  text "'.Designator'" at 0.84,-4.047 h1

## PinHeader_2x16_P1.27mm_Horizontal [mm]
pads (32):
  rect 1x1 hole 0.65: 1(0,0)
  rrect100% 1x1 hole 0.65: 2(1.27,0) 3(0,-1.27) 4(1.27,-1.27) 5(0,-2.54) 6(1.27,-2.54) 7(0,-3.81) 8(1.27,-3.81) 9(0,-5.08) 10(1.27,-5.08) 11(0,-6.35) 12(1.27,-6.35) 13(0,-7.62) 14(1.27,-7.62) 15(0,-8.89) 16(1.27,-8.89) 17(0,-10.16) 18(1.27,-10.16) 19(0,-11.43) 20(1.27,-11.43) 21(0,-12.7) 22(1.27,-12.7) 23(0,-13.97) 24(1.27,-13.97) 25(0,-15.24) 26(1.27,-15.24) 27(0,-16.51) 28(1.27,-16.51) 29(0,-17.78) 30(1.27,-17.78) 31(0,-19.05) 32(1.27,-19.05)
F.SilkS:
  lines w0.12: -0.76,0 -0.76,0.76 0,0.76 ; 1.71,-19.67 1.71,-19.745 2.83,-19.745 2.83,0.695 1.71,0.695 1.71,0.62 ; 1.71,-18.43 1.71,-18.4 ; 1.71,-18.415 2.83,-18.415 ; 1.71,-17.16 1.71,-17.13 ; 1.71,-17.145 2.83,-17.145 ; 1.71,-15.89 1.71,-15.86 ; 1.71,-15.875 2.83,-15.875 ; 1.71,-14.62 1.71,-14.59 ; 1.71,-14.605 2.83,-14.605 ; 1.71,-13.35 1.71,-13.32 ; 1.71,-13.335 2.83,-13.335 ; 1.71,-12.08 1.71,-12.05 ; 1.71,-12.065 2.83,-12.065 ; 1.71,-10.81 1.71,-10.78 ; 1.71,-10.795 2.83,-10.795 ; 1.71,-9.54 1.71,-9.51 ; 1.71,-9.525 2.83,-9.525 ; 1.71,-8.27 1.71,-8.24 ; 1.71,-8.255 2.83,-8.255 ; 1.71,-7 1.71,-6.97 ; 1.71,-6.985 2.83,-6.985 ; 1.71,-5.73 1.71,-5.7 ; 1.71,-5.715 2.83,-5.715 ; 1.71,-4.46 1.71,-4.43 ; 1.71,-4.445 2.83,-4.445 ; 1.71,-3.19 1.71,-3.16 ; 1.71,-3.175 2.83,-3.175 ; 1.71,-1.92 1.71,-1.89 ; 1.71,-1.905 2.83,-1.905 ; 1.71,-0.65 1.71,-0.62 ; 1.71,-0.635 2.83,-0.635 ; 2.83,-19.31 6.83,-19.31 6.83,-18.79 2.83,-18.79 ; 2.83,-18.04 6.83,-18.04 6.83,-17.52 2.83,-17.52 ; 2.83,-16.77 6.83,-16.77 6.83,-16.25 2.83,-16.25 ; 2.83,-15.5 6.83,-15.5 6.83,-14.98 2.83,-14.98 ; 2.83,-14.23 6.83,-14.23 6.83,-13.71 2.83,-13.71 ; 2.83,-12.96 6.83,-12.96 6.83,-12.44 2.83,-12.44 ; 2.83,-11.69 6.83,-11.69 6.83,-11.17 2.83,-11.17 ; 2.83,-10.42 6.83,-10.42 6.83,-9.9 2.83,-9.9 ; 2.83,-9.15 6.83,-9.15 6.83,-8.63 2.83,-8.63 ; 2.83,-7.88 6.83,-7.88 6.83,-7.36 2.83,-7.36 ; 2.83,-6.61 6.83,-6.61 6.83,-6.09 2.83,-6.09 ; 2.83,-5.34 6.83,-5.34 6.83,-4.82 2.83,-4.82 ; 2.83,-4.07 6.83,-4.07 6.83,-3.55 2.83,-3.55 ; 2.83,-2.8 6.83,-2.8 6.83,-2.28 2.83,-2.28 ; 2.83,-1.53 6.83,-1.53 6.83,-1.01 2.83,-1.01 ; 2.83,-0.26 6.83,-0.26 6.83,0.26 2.83,0.26 ; 2.83,-0.16 6.83,-0.16 ; 2.83,-0.04 6.83,-0.04 ; 2.83,0.08 6.83,0.08 ; 2.83,0.2 6.83,0.2
F.CrtYd:
  lines w0.05: -1.15,-20.2 -1.15,1.15 7.3,1.15 7.3,-20.2 -1.15,-20.2
F.Fab:
  lines w0.1: 1.77,-19.25 -0.2,-19.25 -0.2,-18.85 1.77,-18.85 ; 1.77,-17.98 -0.2,-17.98 -0.2,-17.58 1.77,-17.58 ; 1.77,-16.71 -0.2,-16.71 -0.2,-16.31 1.77,-16.31 ; 1.77,-15.44 -0.2,-15.44 -0.2,-15.04 1.77,-15.04 ; 1.77,-14.17 -0.2,-14.17 -0.2,-13.77 1.77,-13.77 ; 1.77,-12.9 -0.2,-12.9 -0.2,-12.5 1.77,-12.5 ; 1.77,-11.63 -0.2,-11.63 -0.2,-11.23 1.77,-11.23 ; 1.77,-10.36 -0.2,-10.36 -0.2,-9.96 1.77,-9.96 ; 1.77,-9.09 -0.2,-9.09 -0.2,-8.69 1.77,-8.69 ; 1.77,-7.82 -0.2,-7.82 -0.2,-7.42 1.77,-7.42 ; 1.77,-6.55 -0.2,-6.55 -0.2,-6.15 1.77,-6.15 ; 1.77,-5.28 -0.2,-5.28 -0.2,-4.88 1.77,-4.88 ; 1.77,-4.01 -0.2,-4.01 -0.2,-3.61 1.77,-3.61 ; 1.77,-2.74 -0.2,-2.74 -0.2,-2.34 1.77,-2.34 ; 1.77,-1.47 -0.2,-1.47 -0.2,-1.07 1.77,-1.07 ; 1.77,-0.2 -0.2,-0.2 -0.2,0.2 1.77,0.2 ; 2.77,-19.25 6.77,-19.25 6.77,-18.85 2.77,-18.85 ; 2.77,-17.98 6.77,-17.98 6.77,-17.58 2.77,-17.58 ; 2.77,-16.71 6.77,-16.71 6.77,-16.31 2.77,-16.31 ; 2.77,-15.44 6.77,-15.44 6.77,-15.04 2.77,-15.04 ; 2.77,-14.17 6.77,-14.17 6.77,-13.77 2.77,-13.77 ; 2.77,-12.9 6.77,-12.9 6.77,-12.5 2.77,-12.5 ; 2.77,-11.63 6.77,-11.63 6.77,-11.23 2.77,-11.23 ; 2.77,-10.36 6.77,-10.36 6.77,-9.96 2.77,-9.96 ; 2.77,-9.09 6.77,-9.09 6.77,-8.69 2.77,-8.69 ; 2.77,-7.82 6.77,-7.82 6.77,-7.42 2.77,-7.42 ; 2.77,-6.55 6.77,-6.55 6.77,-6.15 2.77,-6.15 ; 2.77,-5.28 6.77,-5.28 6.77,-4.88 2.77,-4.88 ; 2.77,-4.01 6.77,-4.01 6.77,-3.61 2.77,-3.61 ; 2.77,-2.74 6.77,-2.74 6.77,-2.34 2.77,-2.34 ; 2.77,-1.47 6.77,-1.47 6.77,-1.07 2.77,-1.07 ; 2.77,-0.2 6.77,-0.2 6.77,0.2 2.77,0.2 ; 1.77,-19.685 2.77,-19.685 2.77,0.635 2.02,0.635 1.77,0.385 1.77,-19.685
  text "'.Designator'" at 2.774,-11.953 h0.6

## PinHeader_2x16_P1.27mm_Vertical [mm]
pads (32):
  rect 1x1 hole 0.65: 1(0,0)
  rrect100% 1x1 hole 0.65: 2(1.27,0) 3(0,-1.27) 4(1.27,-1.27) 5(0,-2.54) 6(1.27,-2.54) 7(0,-3.81) 8(1.27,-3.81) 9(0,-5.08) 10(1.27,-5.08) 11(0,-6.35) 12(1.27,-6.35) 13(0,-7.62) 14(1.27,-7.62) 15(0,-8.89) 16(1.27,-8.89) 17(0,-10.16) 18(1.27,-10.16) 19(0,-11.43) 20(1.27,-11.43) 21(0,-12.7) 22(1.27,-12.7) 23(0,-13.97) 24(1.27,-13.97) 25(0,-15.24) 26(1.27,-15.24) 27(0,-16.51) 28(1.27,-16.51) 29(0,-17.78) 30(1.27,-17.78) 31(0,-19.05) 32(1.27,-19.05)
F.SilkS:
  lines w0.12: -1.13,0 -1.13,0.76 0,0.76 ; -0.563,-0.76 -1.13,-0.76 -1.13,-19.745 -0.308,-19.745 ; 0.308,-19.745 0.962,-19.745 ; 0.563,-0.76 0.707,-0.76 ; 0.76,-0.707 0.76,-0.563 ; 0.76,0.563 0.76,0.695 0.962,0.695 ; 1.578,-19.745 2.4,-19.745 2.4,0.695 1.578,0.695
F.CrtYd:
  lines w0.05: -1.6,-20.2 2.85,-20.2 2.85,1.15 -1.6,1.15 -1.6,-20.2
F.Fab:
  lines w0.1: -1.07,-19.685 2.34,-19.685 2.34,0.635 -0.218,0.635 -1.07,-0.218 -1.07,-19.685
  text "'.Designator'" at 1.475,-13.572 h1

## PinHeader_2x16_P1.27mm_Vertical_SMD [mm]
pads (32):
  rect 2.4x0.74 smd: 1(-1.95,9.525) 2(1.95,9.525) 3(-1.95,8.255) 4(1.95,8.255) 5(-1.95,6.985) 6(1.95,6.985) 7(-1.95,5.715) 8(1.95,5.715) 9(-1.95,4.445) 10(1.95,4.445) 11(-1.95,3.175) 12(1.95,3.175) 13(-1.95,1.905) 14(1.95,1.905) 15(-1.95,0.635) 16(1.95,0.635) 17(-1.95,-0.635) 18(1.95,-0.635) 19(-1.95,-1.905) 20(1.95,-1.905) 21(-1.95,-3.175) 22(1.95,-3.175) 23(-1.95,-4.445) 24(1.95,-4.445) 25(-1.95,-5.715) 26(1.95,-5.715) 27(-1.95,-6.985) 28(1.95,-6.985) 29(-1.95,-8.255) 30(1.95,-8.255) 31(-1.95,-9.525) 32(1.95,-9.525)
F.SilkS:
  lines w0.12: -3.09,10.155 -1.765,10.155 -1.765,10.22 1.765,10.22 1.765,10.155 ; -1.765,-10.155 -1.765,-10.22 1.765,-10.22 1.765,-10.155
F.CrtYd:
  lines w0.05: -4.3,-10.7 4.3,-10.7 4.3,10.7 -4.3,10.7 -4.3,-10.7
F.Fab:
  lines w0.1: -1.705,-9.725 -2.75,-9.725 -2.75,-9.325 -1.705,-9.325 ; -1.705,-8.455 -2.75,-8.455 -2.75,-8.055 -1.705,-8.055 ; -1.705,-7.185 -2.75,-7.185 -2.75,-6.785 -1.705,-6.785 ; -1.705,-5.915 -2.75,-5.915 -2.75,-5.515 -1.705,-5.515 ; -1.705,-4.645 -2.75,-4.645 -2.75,-4.245 -1.705,-4.245 ; -1.705,-3.375 -2.75,-3.375 -2.75,-2.975 -1.705,-2.975 ; -1.705,-2.105 -2.75,-2.105 -2.75,-1.705 -1.705,-1.705 ; -1.705,-0.835 -2.75,-0.835 -2.75,-0.435 -1.705,-0.435 ; -1.705,0.435 -2.75,0.435 -2.75,0.835 -1.705,0.835 ; -1.705,1.705 -2.75,1.705 -2.75,2.105 -1.705,2.105 ; -1.705,2.975 -2.75,2.975 -2.75,3.375 -1.705,3.375 ; -1.705,4.245 -2.75,4.245 -2.75,4.645 -1.705,4.645 ; -1.705,5.515 -2.75,5.515 -2.75,5.915 -1.705,5.915 ; -1.705,6.785 -2.75,6.785 -2.75,7.185 -1.705,7.185 ; -1.705,8.055 -2.75,8.055 -2.75,8.455 -1.705,8.455 ; -1.705,9.325 -2.75,9.325 -2.75,9.725 -1.705,9.725 ; 1.705,-9.725 2.75,-9.725 2.75,-9.325 1.705,-9.325 ; 1.705,-8.455 2.75,-8.455 2.75,-8.055 1.705,-8.055 ; 1.705,-7.185 2.75,-7.185 2.75,-6.785 1.705,-6.785 ; 1.705,-5.915 2.75,-5.915 2.75,-5.515 1.705,-5.515 ; 1.705,-4.645 2.75,-4.645 2.75,-4.245 1.705,-4.245 ; 1.705,-3.375 2.75,-3.375 2.75,-2.975 1.705,-2.975 ; 1.705,-2.105 2.75,-2.105 2.75,-1.705 1.705,-1.705 ; 1.705,-0.835 2.75,-0.835 2.75,-0.435 1.705,-0.435 ; 1.705,0.435 2.75,0.435 2.75,0.835 1.705,0.835 ; 1.705,1.705 2.75,1.705 2.75,2.105 1.705,2.105 ; 1.705,2.975 2.75,2.975 2.75,3.375 1.705,3.375 ; 1.705,4.245 2.75,4.245 2.75,4.645 1.705,4.645 ; 1.705,5.515 2.75,5.515 2.75,5.915 1.705,5.915 ; 1.705,6.785 2.75,6.785 2.75,7.185 1.705,7.185 ; 1.705,8.055 2.75,8.055 2.75,8.455 1.705,8.455 ; 1.705,9.325 2.75,9.325 2.75,9.725 1.705,9.725 ; -1.705,9.725 -1.705,-10.16 1.705,-10.16 1.705,10.16 -1.27,10.16 -1.705,9.725
  text "'.Designator'" at 0.84,-4.047 h1

## PinHeader_2x17_P1.27mm_Horizontal [mm]
pads (34):
  rect 1x1 hole 0.65: 1(0,0)
  rrect100% 1x1 hole 0.65: 2(1.27,0) 3(0,-1.27) 4(1.27,-1.27) 5(0,-2.54) 6(1.27,-2.54) 7(0,-3.81) 8(1.27,-3.81) 9(0,-5.08) 10(1.27,-5.08) 11(0,-6.35) 12(1.27,-6.35) 13(0,-7.62) 14(1.27,-7.62) 15(0,-8.89) 16(1.27,-8.89) 17(0,-10.16) 18(1.27,-10.16) 19(0,-11.43) 20(1.27,-11.43) 21(0,-12.7) 22(1.27,-12.7) 23(0,-13.97) 24(1.27,-13.97) 25(0,-15.24) 26(1.27,-15.24) 27(0,-16.51) 28(1.27,-16.51) 29(0,-17.78) 30(1.27,-17.78) 31(0,-19.05) 32(1.27,-19.05) 33(0,-20.32) 34(1.27,-20.32)
F.SilkS:
  lines w0.12: -0.76,0 -0.76,0.76 0,0.76 ; 1.71,-20.94 1.71,-21.015 2.83,-21.015 2.83,0.695 1.71,0.695 1.71,0.62 ; 1.71,-19.7 1.71,-19.67 ; 1.71,-19.685 2.83,-19.685 ; 1.71,-18.43 1.71,-18.4 ; 1.71,-18.415 2.83,-18.415 ; 1.71,-17.16 1.71,-17.13 ; 1.71,-17.145 2.83,-17.145 ; 1.71,-15.89 1.71,-15.86 ; 1.71,-15.875 2.83,-15.875 ; 1.71,-14.62 1.71,-14.59 ; 1.71,-14.605 2.83,-14.605 ; 1.71,-13.35 1.71,-13.32 ; 1.71,-13.335 2.83,-13.335 ; 1.71,-12.08 1.71,-12.05 ; 1.71,-12.065 2.83,-12.065 ; 1.71,-10.81 1.71,-10.78 ; 1.71,-10.795 2.83,-10.795 ; 1.71,-9.54 1.71,-9.51 ; 1.71,-9.525 2.83,-9.525 ; 1.71,-8.27 1.71,-8.24 ; 1.71,-8.255 2.83,-8.255 ; 1.71,-7 1.71,-6.97 ; 1.71,-6.985 2.83,-6.985 ; 1.71,-5.73 1.71,-5.7 ; 1.71,-5.715 2.83,-5.715 ; 1.71,-4.46 1.71,-4.43 ; 1.71,-4.445 2.83,-4.445 ; 1.71,-3.19 1.71,-3.16 ; 1.71,-3.175 2.83,-3.175 ; 1.71,-1.92 1.71,-1.89 ; 1.71,-1.905 2.83,-1.905 ; 1.71,-0.65 1.71,-0.62 ; 1.71,-0.635 2.83,-0.635 ; 2.83,-20.58 6.83,-20.58 6.83,-20.06 2.83,-20.06 ; 2.83,-19.31 6.83,-19.31 6.83,-18.79 2.83,-18.79 ; 2.83,-18.04 6.83,-18.04 6.83,-17.52 2.83,-17.52 ; 2.83,-16.77 6.83,-16.77 6.83,-16.25 2.83,-16.25 ; 2.83,-15.5 6.83,-15.5 6.83,-14.98 2.83,-14.98 ; 2.83,-14.23 6.83,-14.23 6.83,-13.71 2.83,-13.71 ; 2.83,-12.96 6.83,-12.96 6.83,-12.44 2.83,-12.44 ; 2.83,-11.69 6.83,-11.69 6.83,-11.17 2.83,-11.17 ; 2.83,-10.42 6.83,-10.42 6.83,-9.9 2.83,-9.9 ; 2.83,-9.15 6.83,-9.15 6.83,-8.63 2.83,-8.63 ; 2.83,-7.88 6.83,-7.88 6.83,-7.36 2.83,-7.36 ; 2.83,-6.61 6.83,-6.61 6.83,-6.09 2.83,-6.09 ; 2.83,-5.34 6.83,-5.34 6.83,-4.82 2.83,-4.82 ; 2.83,-4.07 6.83,-4.07 6.83,-3.55 2.83,-3.55 ; 2.83,-2.8 6.83,-2.8 6.83,-2.28 2.83,-2.28 ; 2.83,-1.53 6.83,-1.53 6.83,-1.01 2.83,-1.01 ; 2.83,-0.26 6.83,-0.26 6.83,0.26 2.83,0.26 ; 2.83,-0.16 6.83,-0.16 ; 2.83,-0.04 6.83,-0.04 ; 2.83,0.08 6.83,0.08 ; 2.83,0.2 6.83,0.2
F.CrtYd:
  lines w0.05: -1.15,-21.5 7.3,-21.5 7.3,1.15 -1.15,1.15 -1.15,-21.5
F.Fab:
  lines w0.1: 1.77,-20.52 -0.2,-20.52 -0.2,-20.12 1.77,-20.12 ; 1.77,-19.25 -0.2,-19.25 -0.2,-18.85 1.77,-18.85 ; 1.77,-17.98 -0.2,-17.98 -0.2,-17.58 1.77,-17.58 ; 1.77,-16.71 -0.2,-16.71 -0.2,-16.31 1.77,-16.31 ; 1.77,-15.44 -0.2,-15.44 -0.2,-15.04 1.77,-15.04 ; 1.77,-14.17 -0.2,-14.17 -0.2,-13.77 1.77,-13.77 ; 1.77,-12.9 -0.2,-12.9 -0.2,-12.5 1.77,-12.5 ; 1.77,-11.63 -0.2,-11.63 -0.2,-11.23 1.77,-11.23 ; 1.77,-10.36 -0.2,-10.36 -0.2,-9.96 1.77,-9.96 ; 1.77,-9.09 -0.2,-9.09 -0.2,-8.69 1.77,-8.69 ; 1.77,-7.82 -0.2,-7.82 -0.2,-7.42 1.77,-7.42 ; 1.77,-6.55 -0.2,-6.55 -0.2,-6.15 1.77,-6.15 ; 1.77,-5.28 -0.2,-5.28 -0.2,-4.88 1.77,-4.88 ; 1.77,-4.01 -0.2,-4.01 -0.2,-3.61 1.77,-3.61 ; 1.77,-2.74 -0.2,-2.74 -0.2,-2.34 1.77,-2.34 ; 1.77,-1.47 -0.2,-1.47 -0.2,-1.07 1.77,-1.07 ; 1.77,-0.2 -0.2,-0.2 -0.2,0.2 1.77,0.2 ; 2.77,-20.52 6.77,-20.52 6.77,-20.12 2.77,-20.12 ; 2.77,-19.25 6.77,-19.25 6.77,-18.85 2.77,-18.85 ; 2.77,-17.98 6.77,-17.98 6.77,-17.58 2.77,-17.58 ; 2.77,-16.71 6.77,-16.71 6.77,-16.31 2.77,-16.31 ; 2.77,-15.44 6.77,-15.44 6.77,-15.04 2.77,-15.04 ; 2.77,-14.17 6.77,-14.17 6.77,-13.77 2.77,-13.77 ; 2.77,-12.9 6.77,-12.9 6.77,-12.5 2.77,-12.5 ; 2.77,-11.63 6.77,-11.63 6.77,-11.23 2.77,-11.23 ; 2.77,-10.36 6.77,-10.36 6.77,-9.96 2.77,-9.96 ; 2.77,-9.09 6.77,-9.09 6.77,-8.69 2.77,-8.69 ; 2.77,-7.82 6.77,-7.82 6.77,-7.42 2.77,-7.42 ; 2.77,-6.55 6.77,-6.55 6.77,-6.15 2.77,-6.15 ; 2.77,-5.28 6.77,-5.28 6.77,-4.88 2.77,-4.88 ; 2.77,-4.01 6.77,-4.01 6.77,-3.61 2.77,-3.61 ; 2.77,-2.74 6.77,-2.74 6.77,-2.34 2.77,-2.34 ; 2.77,-1.47 6.77,-1.47 6.77,-1.07 2.77,-1.07 ; 2.77,-0.2 6.77,-0.2 6.77,0.2 2.77,0.2 ; 1.77,-20.955 2.77,-20.955 2.77,0.635 2.02,0.635 1.77,0.385 1.77,-20.955
  text "'.Designator'" at 2.774,-12.588 h0.6

## PinHeader_2x17_P1.27mm_Vertical [mm]
pads (34):
  rect 1x1 hole 0.65: 1(0,0)
  rrect100% 1x1 hole 0.65: 2(1.27,0) 3(0,-1.27) 4(1.27,-1.27) 5(0,-2.54) 6(1.27,-2.54) 7(0,-3.81) 8(1.27,-3.81) 9(0,-5.08) 10(1.27,-5.08) 11(0,-6.35) 12(1.27,-6.35) 13(0,-7.62) 14(1.27,-7.62) 15(0,-8.89) 16(1.27,-8.89) 17(0,-10.16) 18(1.27,-10.16) 19(0,-11.43) 20(1.27,-11.43) 21(0,-12.7) 22(1.27,-12.7) 23(0,-13.97) 24(1.27,-13.97) 25(0,-15.24) 26(1.27,-15.24) 27(0,-16.51) 28(1.27,-16.51) 29(0,-17.78) 30(1.27,-17.78) 31(0,-19.05) 32(1.27,-19.05) 33(0,-20.32) 34(1.27,-20.32)
F.SilkS:
  lines w0.12: -1.13,0 -1.13,0.76 0,0.76 ; -0.563,-0.76 -1.13,-0.76 -1.13,-21.015 -0.308,-21.015 ; 0.308,-21.015 0.962,-21.015 ; 0.563,-0.76 0.707,-0.76 ; 0.76,-0.707 0.76,-0.563 ; 0.76,0.563 0.76,0.695 0.962,0.695 ; 1.578,-21.015 2.4,-21.015 2.4,0.695 1.578,0.695
F.CrtYd:
  lines w0.05: -1.6,-21.5 -1.6,1.15 2.85,1.15 2.85,-21.5 -1.6,-21.5
F.Fab:
  lines w0.1: -1.07,-20.955 2.34,-20.955 2.34,0.635 -0.218,0.635 -1.07,-0.218 -1.07,-20.955
  text "'.Designator'" at 1.475,-14.207 h1